# Altium footprint library EMDC_Packages.PcbLib: 274 footprints (part 17 of 18)
Each footprint in its own frame and in the unit in brackets; x right, y up, seen from the top. Pads: shape width x height; smd on the part's side, far side on the other; paste and mask are expansions set on the pad; w line width, h text height; cw(c..) or ccw(c..) is an arc to the next point about the centre after c.
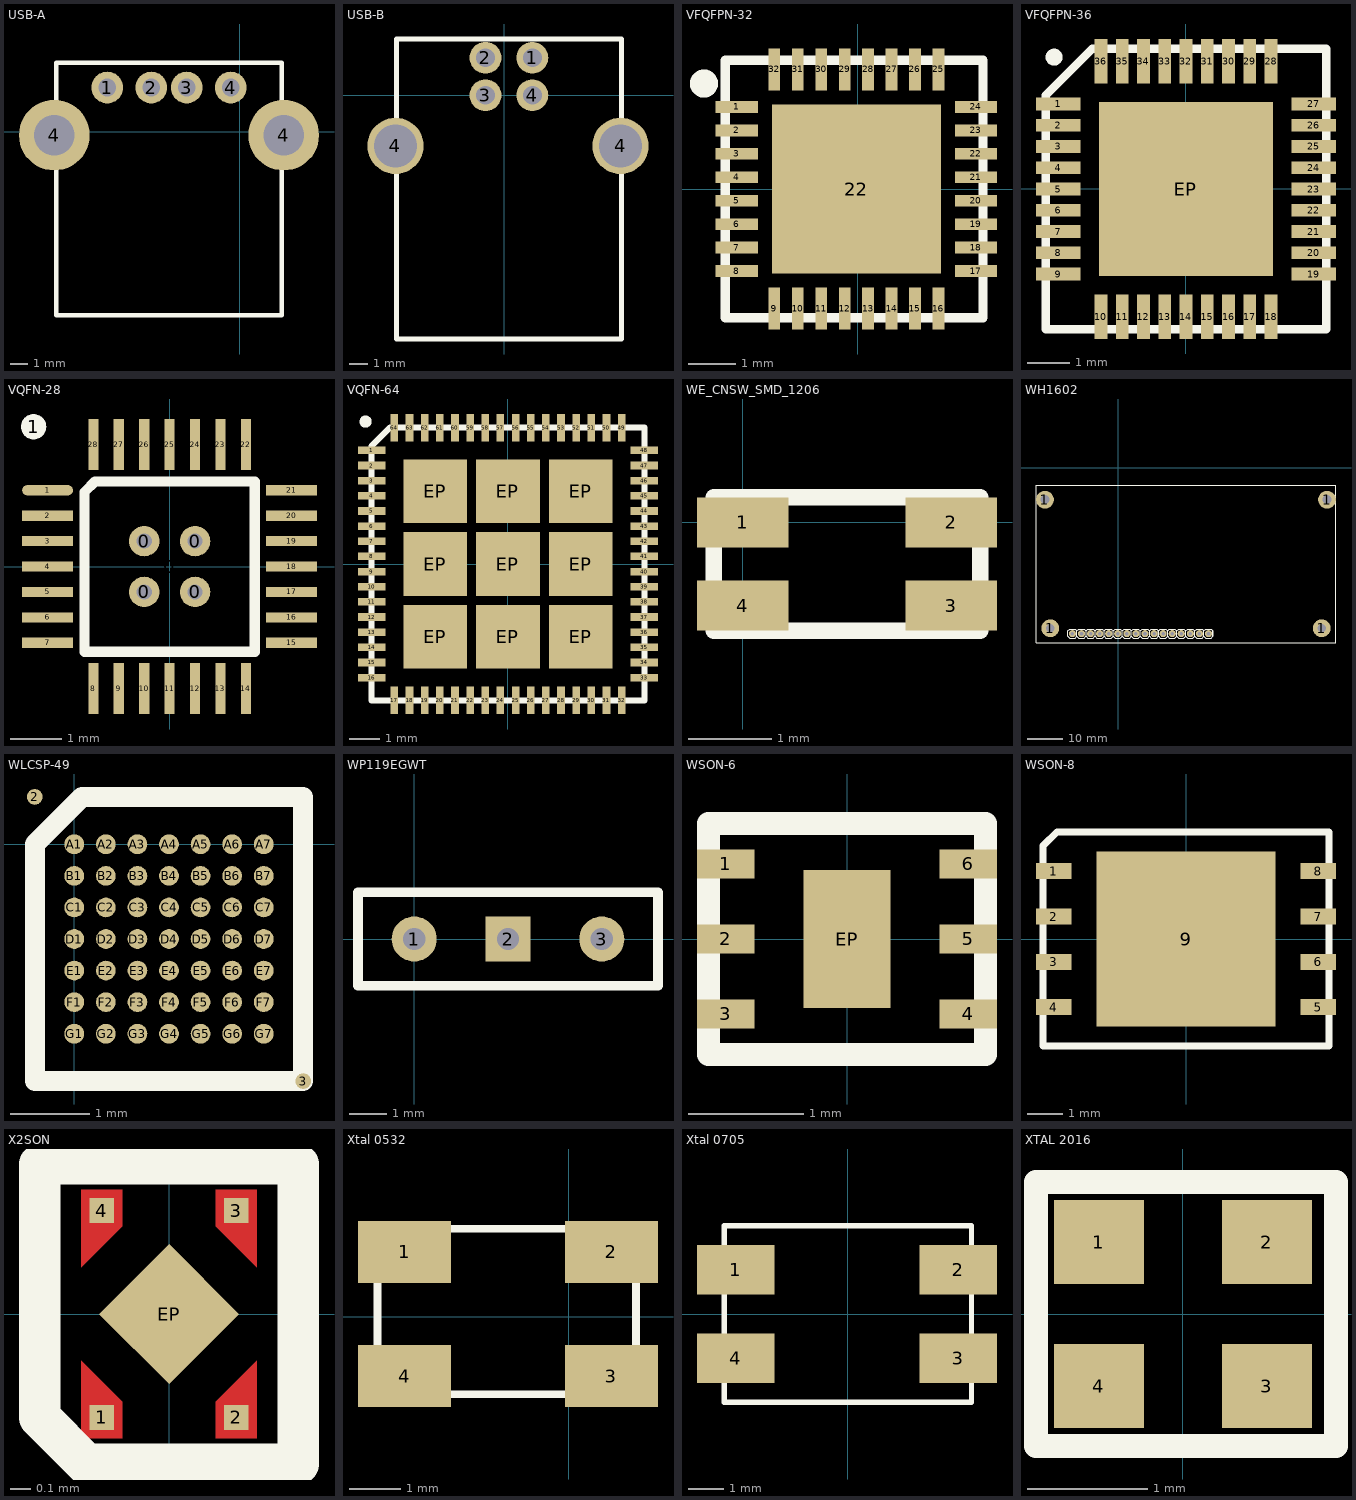
[diagram p16: the footprints below, top view; thin cyan lines are the x and y axes]

## USB-A [mm]
pads (6):
  round 1.8 hole 1: 1(-7.5,2.5) 2(-5,2.5) 3(-3,2.5) 4(-0.5,2.5)
  round 4 hole 2.3: 4(-10.5,-0.2) 4(2.5,-0.2)
Top Overlay:
  lines w0.254: -10.4,-10.4 2.4,-10.4 2.4,3.9 -10.4,3.9 -10.4,-10.4
3D body "SW3dPS-USB-A-01.STEP": height 6.95, standoff -4.2, extent -12.025,-9.975 3.775,3.725

## USB-B [mm]
pads (6):
  round 1.7 hole 1: 1(1.5,2) 2(-1,2) 3(-1,0) 4(1.5,0)
  round 3 hole 2.3: 4(-5.8,-2.7) 4(6.2,-2.7)
Top Overlay:
  lines w0.254: -5.75,-13 -5.75,3 6.25,3 6.25,-13 -5.75,-13
3D body "User Library-Samtec - USB-B-S-X-W-TH.STEP": height 11, standoff -3.64, extent -7.225,-13.15 7.573,3.35

## VFQFPN-32 [mm]
pads (33):
  rect 0.9x0.25 smd: 1(-2.575,1.75) 2(-2.575,1.25) 3(-2.575,0.75) 4(-2.575,0.25) 5(-2.575,-0.25) 6(-2.575,-0.75) 7(-2.575,-1.25) 8(-2.575,-1.75) 17(2.525,-1.75) 18(2.525,-1.25) 19(2.525,-0.75) 20(2.525,-0.25) 21(2.525,0.25) 22(2.525,0.75) 23(2.525,1.25) 24(2.525,1.75)
  rect 0.25x0.9 smd: 9(-1.775,-2.55) 10(-1.275,-2.55) 11(-0.775,-2.55) 12(-0.275,-2.55) 13(0.225,-2.55) 14(0.725,-2.55) 15(1.225,-2.55) 16(1.725,-2.55) 25(1.725,2.55) 26(1.225,2.55) 27(0.725,2.55) 28(0.225,2.55) 29(-0.275,2.55) 30(-0.775,2.55) 31(-1.275,2.55) 32(-1.775,2.55)
  rect 3.6x3.6 smd: 22(-0.025,0)
Top Overlay:
  circle w0.3: c-3.275,2.25 r0.15
  lines w0.2: -2.825,-2.75 2.675,-2.75 2.675,2.75 -2.825,2.75 -2.825,-2.75
3D body "User Library-QFN-32-5x5 - EQ.STEP": height 0.85, standoff 0, extent -2.575,-2.5 2.425,2.5

## VFQFPN-36 [mm] "VFQFPN-36 package"
pads (37):
  rect 1.05x0.3 smd paste+0: 1(-3,2) 2(-3,1.5) 3(-3,1) 4(-3,0.5) 5(-3,0) 6(-3,-0.5) 7(-3,-1) 8(-3,-1.5) 9(-3,-2) 19(3,-2) 20(3,-1.5) 21(3,-1) 22(3,-0.5) 23(3,0) 24(3,0.5) 25(3,1) 26(3,1.5) 27(3,2)
  rect 0.3x1.05 smd paste+0: 10(-2,-3) 11(-1.5,-3) 12(-1,-3) 13(-0.5,-3) 14(0,-3) 15(0.5,-3) 16(1,-3) 17(1.5,-3) 18(2,-3) 28(2,3) 29(1.5,3) 30(1,3) 31(0.5,3) 32(0,3) 33(-0.5,3) 34(-1,3) 35(-1.5,3) 36(-2,3)
  rect 4.1x4.1 smd paste+0: EP(0,0)
Top Overlay:
  circle w0.2: c-3.1,3.1 r0.1
  lines w0.2: -3.3,-3.3 3.3,-3.3 3.3,3.3 -2.2,3.3 -3.3,2.2 -3.3,-3.3
3D body "User Library-QFN36 (6x6).STEP": height 0.9, standoff 0.01, extent -3.102,-3.103 3.103,3.103

## VQFN-28 [mm]
pads (34):
  round 0.6 hole 0.3: 0(-0.5,-0.5) 0(-0.5,0.5) 0(0.5,-0.5) 0(0.5,0.5)
  round 0.5 on Top Solder: 0(0,0)
  round 0.5 on Top Overlay: 1(-2.675,2.75)
  oval 1x0.2 smd: 1(-2.4,1.5)
  rect 1x0.2 smd: 2(-2.4,1) 3(-2.4,0.5) 4(-2.4,0) 5(-2.4,-0.5) 6(-2.4,-1) 7(-2.4,-1.5) 15(2.4,-1.5) 16(2.4,-1) 17(2.4,-0.5) 18(2.4,0) 19(2.4,0.5) 20(2.4,1) 21(2.4,1.5)
  rect 0.2x1 smd: 8(-1.5,-2.4) 9(-1,-2.4) 10(-0.5,-2.4) 11(0,-2.4) 12(0.5,-2.4) 13(1,-2.4) 14(1.5,-2.4) 22(1.5,2.4) 23(1,2.4) 24(0.5,2.4) 25(0,2.4) 26(-0.5,2.4) 27(-1,2.4) 28(-1.5,2.4)
Top Overlay:
  lines w0.2: -1.675,-1.675 -1.675,1.465 -1.465,1.675 1.675,1.675 1.675,-1.675 -1.675,-1.675
Top Solder:
  rectangle: 0.95,-0.5 1.5,0.5
  rectangle: 0.8,-1.5 1.5,-0.8
  rectangle: 0.8,0.8 1.5,1.5
  rectangle: -0.5,0.95 0.5,1.5
  rectangle: -1.5,0.8 -0.8,1.5
  rectangle: -1.5,-0.5 -0.95,0.5
  rectangle: -1.5,-1.5 -0.8,-0.8
  rectangle: -0.5,-1.5 0.5,-0.95
3D body "User Library-ATmega 168.STEP": height 0.02, standoff -0.8, extent -2.002,-2.002 2,2

## VQFN-64 [mm]
pads (73):
  rect 0.9x0.25 smd: 1(-4.5,3.75) 2(-4.5,3.25) 3(-4.5,2.75) 4(-4.5,2.25) 5(-4.5,1.75) 6(-4.5,1.25) 7(-4.5,0.75) 8(-4.5,0.25) 9(-4.5,-0.25) 10(-4.5,-0.75) 11(-4.5,-1.25) 12(-4.5,-1.75) 13(-4.5,-2.25) 14(-4.5,-2.75) 15(-4.5,-3.25) 16(-4.5,-3.75) 33(4.5,-3.75) 34(4.5,-3.25) 35(4.5,-2.75) 36(4.5,-2.25) 37(4.5,-1.75) 38(4.5,-1.25) 39(4.5,-0.75) 40(4.5,-0.25) 41(4.5,0.25) 42(4.5,0.75) 43(4.5,1.25) 44(4.5,1.75) 45(4.5,2.25) 46(4.5,2.75) 47(4.5,3.25) 48(4.5,3.75)
  rect 0.25x0.9 smd: 17(-3.75,-4.5) 18(-3.25,-4.5) 19(-2.75,-4.5) 20(-2.25,-4.5) 21(-1.75,-4.5) 22(-1.25,-4.5) 23(-0.75,-4.5) 24(-0.25,-4.5) 25(0.25,-4.5) 26(0.75,-4.5) 27(1.25,-4.5) 28(1.75,-4.5) 29(2.25,-4.5) 30(2.75,-4.5) 31(3.25,-4.5) 32(3.75,-4.5) 49(3.75,4.5) 50(3.25,4.5) 51(2.75,4.5) 52(2.25,4.5) 53(1.75,4.5) 54(1.25,4.5) 55(0.75,4.5) 56(0.25,4.5) 57(-0.25,4.5) 58(-0.75,4.5) 59(-1.25,4.5) 60(-1.75,4.5) 61(-2.25,4.5) 62(-2.75,4.5) 63(-3.25,4.5) 64(-3.75,4.5)
  rect 2.1x2.1 smd mask+0.2: EP(-2.4,-2.4) EP(-2.4,0) EP(-2.4,2.4) EP(0,-2.4) EP(0,0) EP(0,2.4) EP(2.4,-2.4) EP(2.4,0) EP(2.4,2.4)
Top Overlay:
  circle w0.2: c-4.7,4.7 r0.1
  lines w0.2: -4.5,-4.5 4.5,-4.5 4.5,4.5 -3.9,4.5 -4.5,3.9 -4.5,-4.5
3D body "User Library-vqfn-64.STEP": height 1.05, standoff 0, extent -4.56,-4.575 4.61,4.595

## WE_CNSW_SMD_1206 [mm] "WE-CNSW SMD 1206 Common Mode Line Filter 744232222"
pads (4):
  rect 1.1x0.6 smd: 1(0,0) 2(2.5,0) 3(2.5,-1) 4(0,-1)
Top Overlay:
  lines w0.2: -0.35,-1.3 -0.35,0.3 2.85,0.3 2.85,-1.3 -0.35,-1.3
3D body "WE-CNSW_1206_CNSW.stp": height 1.9, standoff 0, extent -0.35,-1.3 2.85,0.3

## WH1602 [mm]
pads (20):
  round 5 hole 2.5: 1(-20.5,-9) 1(-19,-45) 1(57,-45) 1(58.5,-9)
  round 2 hole 1: 1(-12.8,-46.5) 2(-10.26,-46.5) 3(-7.72,-46.5) 4(-5.18,-46.5) 5(-2.64,-46.5) 6(-0.1,-46.5) 7(2.44,-46.5) 8(4.98,-46.5) 9(7.52,-46.5) 10(10.06,-46.5) 11(12.6,-46.5) 12(15.14,-46.5) 13(17.68,-46.5) 14(20.22,-46.5) 15(22.76,-46.5) 16(25.3,-46.5)
Top Overlay:
  lines w0.2: -9.05,-47.25 -9.55,-47.75 -11.05,-47.75 -11.55,-47.25 ; -9.05,-45.75 -9.55,-45.25 -11.05,-45.25 -11.55,-45.75 ; -6.49,-47.25 -6.99,-47.75 -8.49,-47.75 -8.99,-47.25 -8.99,-45.75 -8.49,-45.25 -6.99,-45.25 -6.49,-45.75 ; 1.13,-47.25 0.63,-47.75 -0.87,-47.75 -1.37,-47.25 -1.37,-45.75 -0.87,-45.25 0.63,-45.25 1.13,-45.75 ; 6.19,-47.25 5.69,-47.75 4.19,-47.75 3.69,-47.25 ; 6.19,-45.75 5.69,-45.25 4.19,-45.25 3.69,-45.75 ; 8.75,-47.25 8.25,-47.75 6.75,-47.75 6.25,-47.25 6.25,-45.75 6.75,-45.25 8.25,-45.25 8.75,-45.75 ; 16.37,-47.25 15.87,-47.75 14.37,-47.75 13.87,-47.25 13.87,-45.75 14.37,-45.25 15.87,-45.25 16.37,-45.75 ; 21.43,-47.25 20.93,-47.75 19.43,-47.75 18.93,-47.25 ; 21.43,-45.75 20.93,-45.25 19.43,-45.25 18.93,-45.75 ; 23.99,-47.25 23.49,-47.75 21.99,-47.75 21.49,-47.25 21.49,-45.75 21.99,-45.25 23.49,-45.25 23.99,-45.75 ; 26.57,-47.25 26.57,-45.75 ; -11.55,-47.25 -12.05,-47.75 -13.55,-47.75 -14.05,-47.25 -14.05,-45.75 -13.55,-45.25 -12.05,-45.25 -11.55,-45.75 ; -11.55,-47.25 -11.55,-45.75 ; 3.69,-47.25 3.69,-45.75 ; 3.69,-47.25 3.19,-47.75 1.69,-47.75 1.19,-47.25 1.19,-45.75 1.69,-45.25 3.19,-45.25 3.69,-45.75 ; 18.93,-47.25 18.93,-45.75 ; 18.93,-47.25 18.43,-47.75 16.93,-47.75 16.43,-47.25 16.43,-45.75 16.93,-45.25 18.43,-45.25 18.93,-45.75 ; -6.45,-47.25 -5.95,-47.75 -4.45,-47.75 -3.95,-47.25 -3.95,-45.75 -4.45,-45.25 -5.95,-45.25 -6.45,-45.75 -6.45,-47.25 ; -3.91,-47.25 -3.41,-47.75 -1.91,-47.75 -1.41,-47.25 -1.41,-45.75 -1.91,-45.25 -3.41,-45.25 -3.91,-45.75 -3.91,-47.25 ; 8.79,-47.25 8.79,-45.75 9.29,-45.25 10.79,-45.25 11.29,-45.75 11.29,-47.25 10.79,-47.75 9.29,-47.75 8.79,-47.25 ; 11.33,-47.25 11.33,-45.75 11.83,-45.25 13.33,-45.25 13.83,-45.75 13.83,-47.25 13.33,-47.75 11.83,-47.75 11.33,-47.25 ; 24.03,-47.25 24.03,-45.75 24.53,-45.25 26.03,-45.25 26.53,-45.75 26.53,-47.25 26.03,-47.75 24.53,-47.75 24.03,-47.25
  lines w0.254: -23,-49 -23,-5 61,-5 61,-49 -23,-49
3D body "User Library-2x16mavilcd.STEP": height 12.1, standoff 2.5, extent -23,-49 61,-5
3D body "User Library-PLS-1.STEP": height 8.44, standoff -3, extent 24.03,-47.77 26.57,-45.23
3D body "User Library-PLS-1.STEP": height 8.44, standoff -3, extent 21.49,-47.77 24.03,-45.23
3D body "User Library-PLS-1.STEP": height 8.44, standoff -3, extent 18.95,-47.77 21.49,-45.23
3D body "User Library-PLS-1.STEP": height 8.44, standoff -3, extent 16.41,-47.77 18.95,-45.23
3D body "User Library-PLS-1.STEP": height 8.44, standoff -3, extent 13.87,-47.77 16.41,-45.23
3D body "User Library-PLS-1.STEP": height 8.44, standoff -3, extent 11.33,-47.77 13.87,-45.23
3D body "User Library-PLS-1.STEP": height 8.44, standoff -3, extent 8.79,-47.77 11.33,-45.23
3D body "User Library-PLS-1.STEP": height 8.44, standoff -3, extent 6.25,-47.77 8.79,-45.23
3D body "User Library-PLS-1.STEP": height 8.44, standoff -3, extent 3.71,-47.77 6.25,-45.23
3D body "User Library-PLS-1.STEP": height 8.44, standoff -3, extent 1.17,-47.77 3.71,-45.23
3D body "User Library-PLS-1.STEP": height 8.44, standoff -3, extent -1.37,-47.77 1.17,-45.23
3D body "User Library-PLS-1.STEP": height 8.44, standoff -3, extent -3.91,-47.77 -1.37,-45.23
3D body "User Library-PLS-1.STEP": height 8.44, standoff -3, extent -6.45,-47.77 -3.91,-45.23
3D body "User Library-PLS-1.STEP": height 8.44, standoff -3, extent -8.99,-47.77 -6.45,-45.23
3D body "User Library-PLS-1.STEP": height 8.44, standoff -3, extent -11.53,-47.77 -8.99,-45.23
3D body "User Library-PLS-1.STEP": height 8.44, standoff -3, extent -14.07,-47.77 -11.53,-45.23

## WLCSP-49 [mm] "3x3mm, 0.4mm"
pads (51):
  round 0.2 smd mask+0.2: 2(-0.5,0.6) 3(2.9,-3)
  round 0.25 smd: A1(0,0) A2(0.4,0) A3(0.8,0) A4(1.2,0) A5(1.6,0) A6(2,0) A7(2.4,0) B1(0,-0.4) B2(0.4,-0.4) B3(0.8,-0.4) B4(1.2,-0.4) B5(1.6,-0.4) B6(2,-0.4) B7(2.4,-0.4) C1(0,-0.8) C2(0.4,-0.8) C3(0.8,-0.8) C4(1.2,-0.8) C5(1.6,-0.8) C6(2,-0.8) C7(2.4,-0.8) D1(0,-1.2) D2(0.4,-1.2) D3(0.8,-1.2) D4(1.2,-1.2) D5(1.6,-1.2) D6(2,-1.2) D7(2.4,-1.2) E1(0,-1.6) E2(0.4,-1.6) E3(0.8,-1.6) E4(1.2,-1.6) E5(1.6,-1.6) E6(2,-1.6) E7(2.4,-1.6) F1(0,-2) F2(0.4,-2) F3(0.8,-2) F4(1.2,-2) F5(1.6,-2) F6(2,-2) F7(2.4,-2) G1(0,-2.4) G2(0.4,-2.4) G3(0.8,-2.4) G4(1.2,-2.4) G5(1.6,-2.4) G6(2,-2.4) G7(2.4,-2.4)
Top Overlay:
  lines w0.254: -0.5,-3 -0.5,0 0.1,0.6 2.9,0.6 2.9,-3 -0.5,-3
3D body: height 0.5, standoff 0, extent -0.3,-2.8 2.7,0.4

## WP119EGWT [mm] "Two color LED"
height 18
pads (3):
  round 1.2 hole 0.6: 1(0,0) 3(5,0)
  rect 1.2x1.2 hole 0.6: 2(2.5,0)
Top Overlay:
  lines w0.254: -1.5,-1.25 6.5,-1.25 6.5,1.25 -1.5,1.25 -1.5,-1.25

## WSON-6 [mm]
pads (7):
  rect 0.5x0.25 smd: 1(-1.05,0.65) 2(-1.05,0) 3(-1.05,-0.65) 4(1.05,-0.65) 5(1.05,0) 6(1.05,0.65)
  rect 0.75x1.2 smd: EP(0,0)
Top Overlay:
  lines w0.2: -1.2,-1 1.2,-1 1.2,1 -1.2,1 -1.2,-1
3D body: height 0.8, standoff 0, extent -1.25,-1.1 1.25,1.1

## WSON-8 [mm] "WSON 8pin 8x6mm"
pads (9):
  rect 1x0.45 smd: 1(-3.7,1.9) 2(-3.7,0.63) 3(-3.7,-0.64) 4(-3.7,-1.91) 5(3.7,-1.91) 6(3.7,-0.64) 7(3.7,0.63) 8(3.7,1.9)
  rect 5x4.9 smd: 9(0,0)
Top Overlay:
  lines w0.2: -4,-3 3,-3 4,-3 4,3 -3.61,3 -4,2.61 -4,-3
3D body "User Library-WSON-8_6x8mm.STEP": height 0.81, standoff -0.07, extent -4,-3 4,3

## X2SON [mm]
pads (5):
  rect 0.12x0.12 smd: 1(-0.325,-0.5) 2(0.325,-0.5) 3(0.325,0.5) 4(-0.325,0.5)
  rect 0.48x0.48 smd rot 45 mask+0: EP(0,0)
Top Layer:
  region: 0.425,-0.225 0.425,-0.6 0.225,-0.6 0.225,-0.425
  region: 0.425,0.225 0.425,0.6 0.225,0.6 0.225,0.425
  region: -0.425,0.225 -0.425,0.6 -0.225,0.6 -0.225,0.425
  region: -0.425,-0.225 -0.425,-0.6 -0.225,-0.6 -0.225,-0.425
Top Overlay:
  lines w0.2: -0.625,-0.5 -0.625,0.725 0.625,0.725 0.625,-0.725 -0.4,-0.725 -0.625,-0.5
Top Solder:
  rectangle: -0.5,-0.5 0.5,0.5
3D body: height 0.38, standoff 0, extent -0.5,-0.5 0.5,0.5

## Xtal 0532 [mm]
pads (4):
  rect 1.8x1.2 smd: 1(-3.175,1.25) 2(0.825,1.25) 3(0.825,-1.15) 4(-3.175,-1.15)
Top Overlay:
  lines w0.15: -3.7,-1.5 -3.7,1.7 1.3,1.7 1.3,-1.5 -3.7,-1.5
3D body "User Library-GeyerElectronics_KX9B.STEP": height 1.12, standoff 0, extent -3.705,-1.505 1.305,1.705

## Xtal 0705 [mm]
pads (4):
  rect 2.2x1.4 smd: 1(-3.175,1.25) 2(3.125,1.25) 3(3.125,-1.25) 4(-3.175,-1.25)
Top Overlay:
  lines w0.15: -3.5,-2.5 3.5,-2.5 3.5,2.5 -3.5,2.5 -3.5,-2.5
3D body "Crystal-0705.step": height 1.31, standoff 0, extent -3.5,-2.525 3.5,2.475

## XTAL 2016 [mm] "KX-5"
pads (4):
  rect 0.75x0.7 smd: 1(-0.7,0.6) 2(0.7,0.6) 3(0.7,-0.6) 4(-0.7,-0.6)
Top Overlay:
  lines w0.2: -1.225,-1.1 -1.225,1.1 1.275,1.1 1.275,-1.1 -1.225,-1.1
3D body "User Library-GeyerElectronics_KX5.step": height 0.56, standoff 0, extent -1.05,-0.85 1.05,0.85